# Altium footprint library RoBeast_PCB_Library.PcbLib: 71 footprints (part 4 of 5)
Each footprint in its own frame and in the unit in brackets; x right, y up, seen from the top. Pads: shape width x height; smd on the part's side, far side on the other; paste and mask are expansions set on the pad; w line width, h text height; cw(c..) or ccw(c..) is an arc to the next point about the centre after c.
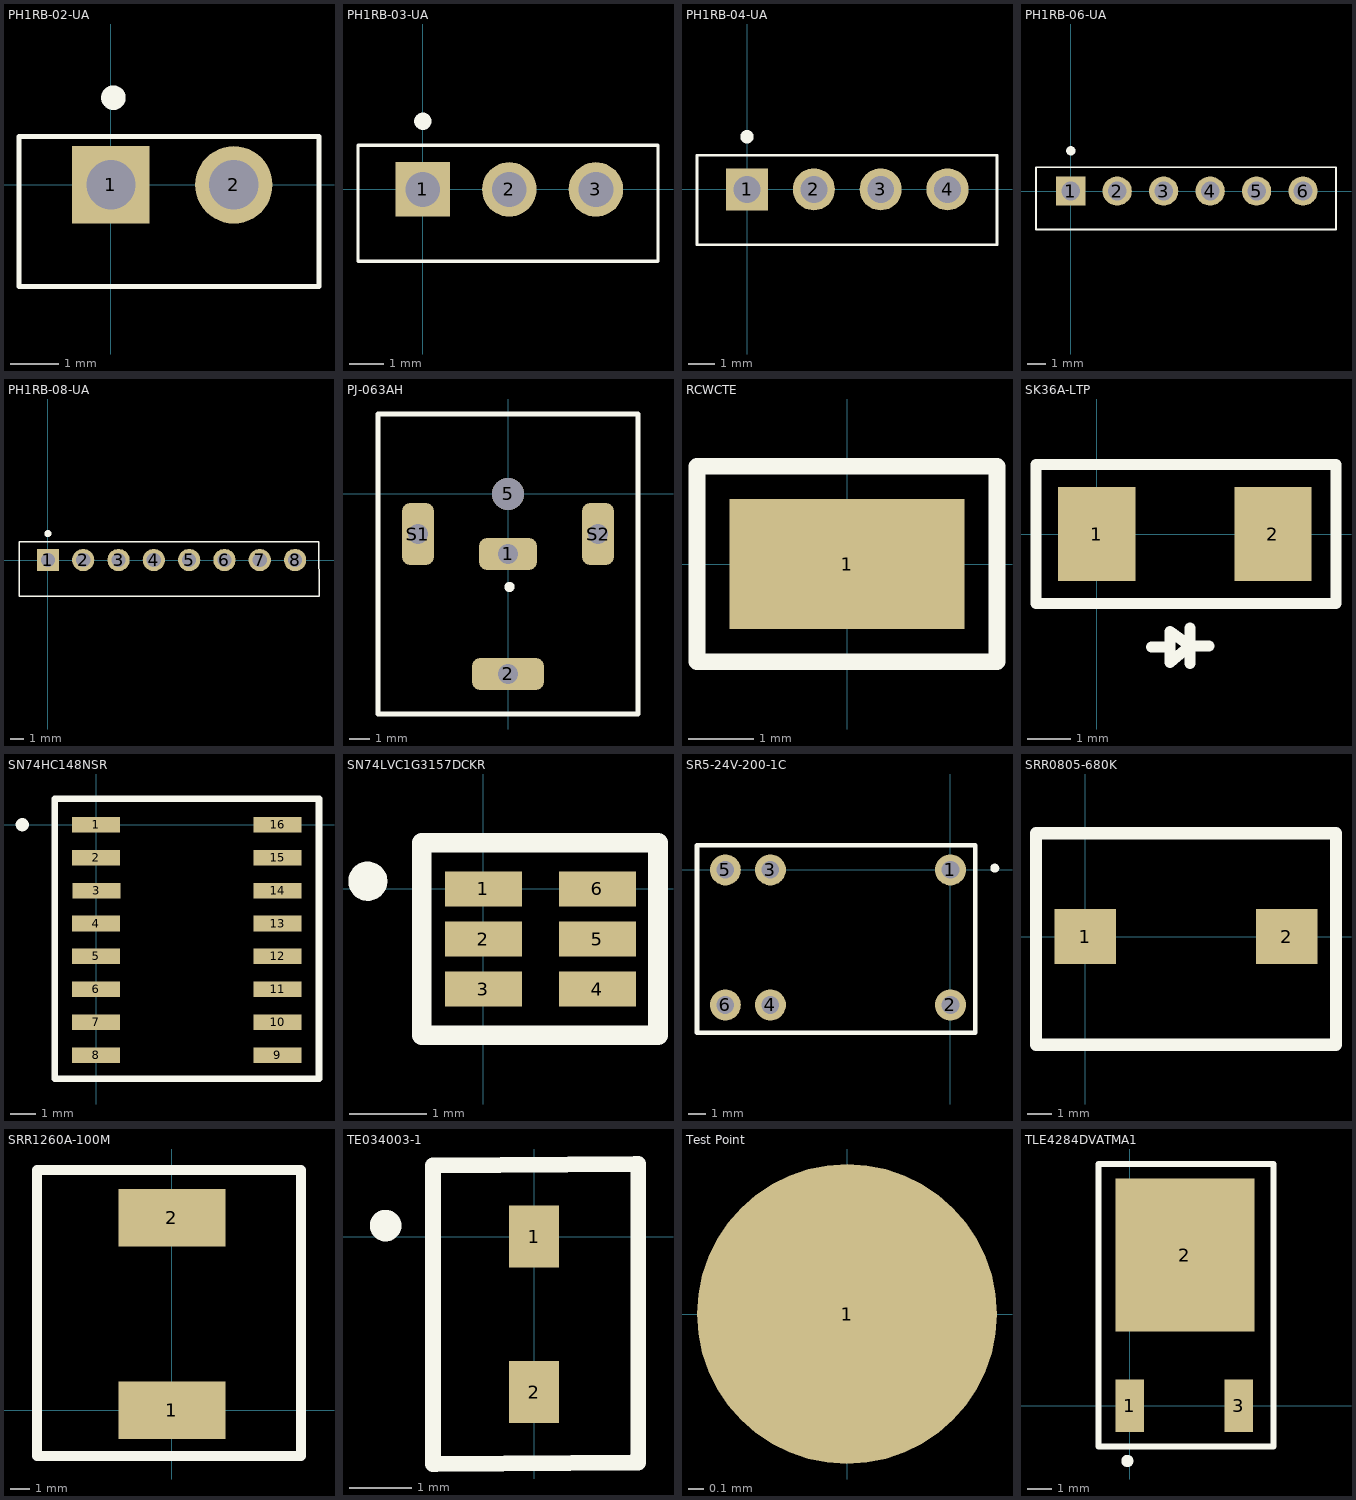
[diagram p3: the footprints below, top view; thin cyan lines are the x and y axes]

## PH1RB-02-UA [mm]
pads (2):
  rect 1.6x1.6 hole 1.02: 1(0,0)
  round 1.6 hole 1.02: 2(2.54,0)
Top Overlay:
  circle w0.254: c0.051,1.803 r0.127
  lines w0.1: -1.9,-2.1 4.3,-2.1 4.3,1 -1.9,1 -1.9,-2.1
3D body "PH1RB-02-UA.STEP": height 1.25, standoff -4.3, extent -1.31,-9.65 3.777,0.57

## PH1RB-03-UA [mm]
pads (3):
  rect 1.6x1.6 hole 1.02: 1(0,0)
  round 1.6 hole 1.02: 2(2.54,0) 3(5.08,0)
Top Overlay:
  circle w0.254: c0,2 r0.127
  lines w0.1: -1.9,-2.1 6.9,-2.1 6.9,1.3 -1.9,1.3 -1.9,-2.1
3D body "PH1RB-03-UA.STEP": height 2.25, standoff -3.3, extent -1.15,-9.85 6.477,0.37

## PH1RB-04-UA [mm]
pads (4):
  rect 1.6x1.6 hole 1.02: 1(0,0)
  round 1.6 hole 1.02: 2(2.54,0) 3(5.08,0) 4(7.62,0)
Top Overlay:
  circle w0.254: c0,2 r0.127
  lines w0.1: -1.9,-2.1 9.5,-2.1 9.5,1.3 -1.9,1.3 -1.9,-2.1
3D body "PH1RB-04-UA.STEP": height 1.25, standoff -4.3, extent -1.29,-9.75 8.877,0.47

## PH1RB-06-UA [mm]
pads (6):
  rect 1.6x1.6 hole 1.02: 1(0,0)
  round 1.6 hole 1.02: 2(2.54,0) 3(5.08,0) 4(7.62,0) 5(10.16,0) 6(12.7,0)
Top Overlay:
  circle w0.254: c0,2.2 r0.127
  lines w0.1: -1.9,-2.1 14.5,-2.1 14.5,1.3 -1.9,1.3 -1.9,-2.1
3D body "CONN_PH1RB-06.step": height 1.52, standoff -5.84, extent -1.3,-9.962 13.94,0.3

## PH1RB-08-UA [mm]
pads (8):
  rect 1.6x1.6 hole 1.02: 1(0,0)
  round 1.6 hole 1.02: 2(2.54,0) 3(5.08,0) 4(7.62,0) 5(10.16,0) 6(12.7,0) 7(15.24,0) 8(17.78,0)
Top Overlay:
  circle w0.254: c0,1.9 r0.127
  lines w0.1: -2.079,-2.6 19.5,-2.6 19.5,1.3 -2.078,1.3 -2.079,-2.6
3D body "PH1RB-08-UA.STEP": height 4.25, standoff -1.3, extent -1.321,-9.79 19.006,0.43

## PJ-063AH [mm]
pads (5):
  rrect50% 2.9x1.6 hole 1 square: 1(0,-3)
  rrect50% 3.6x1.6 hole 1 square: 2(0,-9)
  round 1.6 hole 1.6 unplated: 5(0,0)
  rrect50% 1.6x3.1 hole 1 square: S1(-4.5,-2) S2(4.5,-2)
Top Overlay:
  circle w0.254: c0.076,-4.648 r0.127
  lines w0.254: -6.5,-11 -6.5,4 6.5,4 6.5,-11 -6.5,-11
3D body "CUI_DEVICES_PJ-063AH.step": height 9, standoff -3, extent -5.017,-10.132 5.283,2.868

## RCWCTE [mm]
pads (1):
  rect 3.6x2 smd: 1(0,0)
Top Overlay:
  lines w0.254: -2.3,-1.5 -2.3,1.5 2.3,1.5 2.3,-1.5 -2.3,-1.5
3D body "RCWCTE.step": height 2.01, standoff 0, extent -1.612,-0.784 1.588,0.816

## SK36A-LTP [mm]
pads (2):
  rect 1.78x2.16 smd: 1(0,0) 2(4.05,0)
Top Overlay:
  lines w0.254: 1.254,-2.595 1.686,-2.595 ; 2.143,-2.976 2.143,-2.57 ; 2.143,-2.164 2.143,-2.57 ; 2.575,-2.57 2.143,-2.57 ; 1.686,-2.595 1.686,-2.951 2.143,-2.57 ; 1.686,-2.595 1.686,-2.24 2.143,-2.57 ; -1.4,-1.6 -1.4,1.6 5.5,1.6 5.5,-1.6 -1.4,-1.6
3D body "SK34A-LTP.STEP": height 2.95, standoff 0, extent -0.625,-1.252 4.825,1.452

## SN74HC148NSR [mm]
pads (16):
  rect 1.85x0.6 smd: 1(0,0) 2(0,-1.27) 3(0.015,-2.54) 4(0,-3.81) 5(0,-5.08) 6(0,-6.35) 7(0,-7.62) 8(0,-8.89) 9(7,-8.89) 10(7,-7.62) 11(7,-6.35) 12(7,-5.08) 13(7,-3.81) 14(7,-2.54) 15(7,-1.27) 16(7,0)
Top Overlay:
  circle w0.254: c-2.849,0.003 r0.127
  lines w0.254: -1.6,-9.8 -1.6,1 8.6,1 8.6,-9.8 -1.6,-9.8
3D body "NS0016A.stp": height 2, standoff 0, extent -0.502,-9.528 7.298,0.672

## SN74LVC1G3157DCKR [mm]
pads (6):
  rect 1x0.45 smd mask+0.051: 1(0,0) 2(0,-0.65) 3(0,-1.3) 4(1.48,-1.3) 5(1.48,-0.65) 6(1.48,0)
Top Overlay:
  circle w0.254: c-1.5,0.1 r0.127
  lines w0.254: -0.8,-1.9 2.267,-1.9 2.267,0.6 -0.8,0.6 -0.8,-1.9
3D body "DCK0006A.stp": height 1, standoff 0, extent -0.348,-1.64 1.752,0.36

## SR5-24V-200-1C [mm]
pads (6):
  round 1.75 hole 1: 1(0,0) 2(0,-7.62) 3(-10.16,0) 4(-10.16,-7.62) 5(-12.7,0) 6(-12.7,-7.62)
Top Overlay:
  circle w0.254: c2.5,0.1 r0.127
  lines w0.254: -14.3,-9.2 1.4,-9.2 1.4,1.4 -14.3,1.4 -14.3,-9.2
3D body "c-3-1393779-7-b-3d.stp": height 12, standoff -2.9, extent -14.05,-9.05 1.45,1.45

## SRR0805-680K [mm]
pads (2):
  rect 2.5x2.25 smd: 1(0,0) 2(8.2,0)
Top Overlay:
  lines w0.5: -2,-4.4 10.2,-4.4 10.2,4.2 -2,4.2 -2,-4.4
3D body "srr0805.stp": height 4.7, standoff 0, extent -1.15,-4.1 9.35,3.9

## SRR1260A-100M [mm]
pads (2):
  rect 5.4x2.9 smd: 1(0,0) 2(0,9.7)
Top Overlay:
  lines w0.5: -6.8,-2.3 -6.8,12.1 6.5,12.1 6.5,-2.3 -6.8,-2.3
3D body "SRR1260A.STP": height 6.25, standoff 0, extent -6.35,-1.25 6.15,11.25

## TE034003-1 [mm]
pads (2):
  rect 0.8x1 smd: 1(0,0) 2(0,-2.5)
Top Overlay:
  circle w0.254: c-2.388,0.178 r0.127
  lines w0.254: 1.575,-3.632 1.676,-3.632 ; 1.626,-3.632 1.676,-3.632 ; 1.676,-3.632 1.676,1.168 1.626,1.168 -1.626,1.143 -1.626,-3.658 -1.575,-3.658 1.676,-3.632
3D body "SMI-1324-TW-5V-5-R-TR.step": height 9.62, standoff -0.4, extent -6.399,-8.087 6.401,6.563

## Test Point [mm]
pads (1):
  round 2 smd mask+0.01: 1(0,0)

## TLE4284DVATMA1 [mm]
pads (3):
  rect 1.2x2.2 smd: 1(0,0) 3(4.55,0)
  rect 5.8x6.4 smd: 2(2.3,6.3)
Top Overlay:
  circle w0.254: c-0.1,-2.3 r0.127
  lines w0.254: -1.3,-1.7 -1.3,10.1 6,10.1 6,-1.7 -1.3,-1.7
3D body "IPD50P04P4L-11--3DModel-STEP-56544.STEP": height 2.45, standoff -0.05, extent -0.95,-1.033 5.55,8.947